# Altium footprint library Разъемы.PcbLib: 291 footprints (part 7 of 19)
Each footprint in its own frame and in the unit in brackets; x right, y up, seen from the top. Pads: shape width x height; smd on the part's side, far side on the other; paste and mask are expansions set on the pad; w line width, h text height; cw(c..) or ccw(c..) is an arc to the next point about the centre after c.
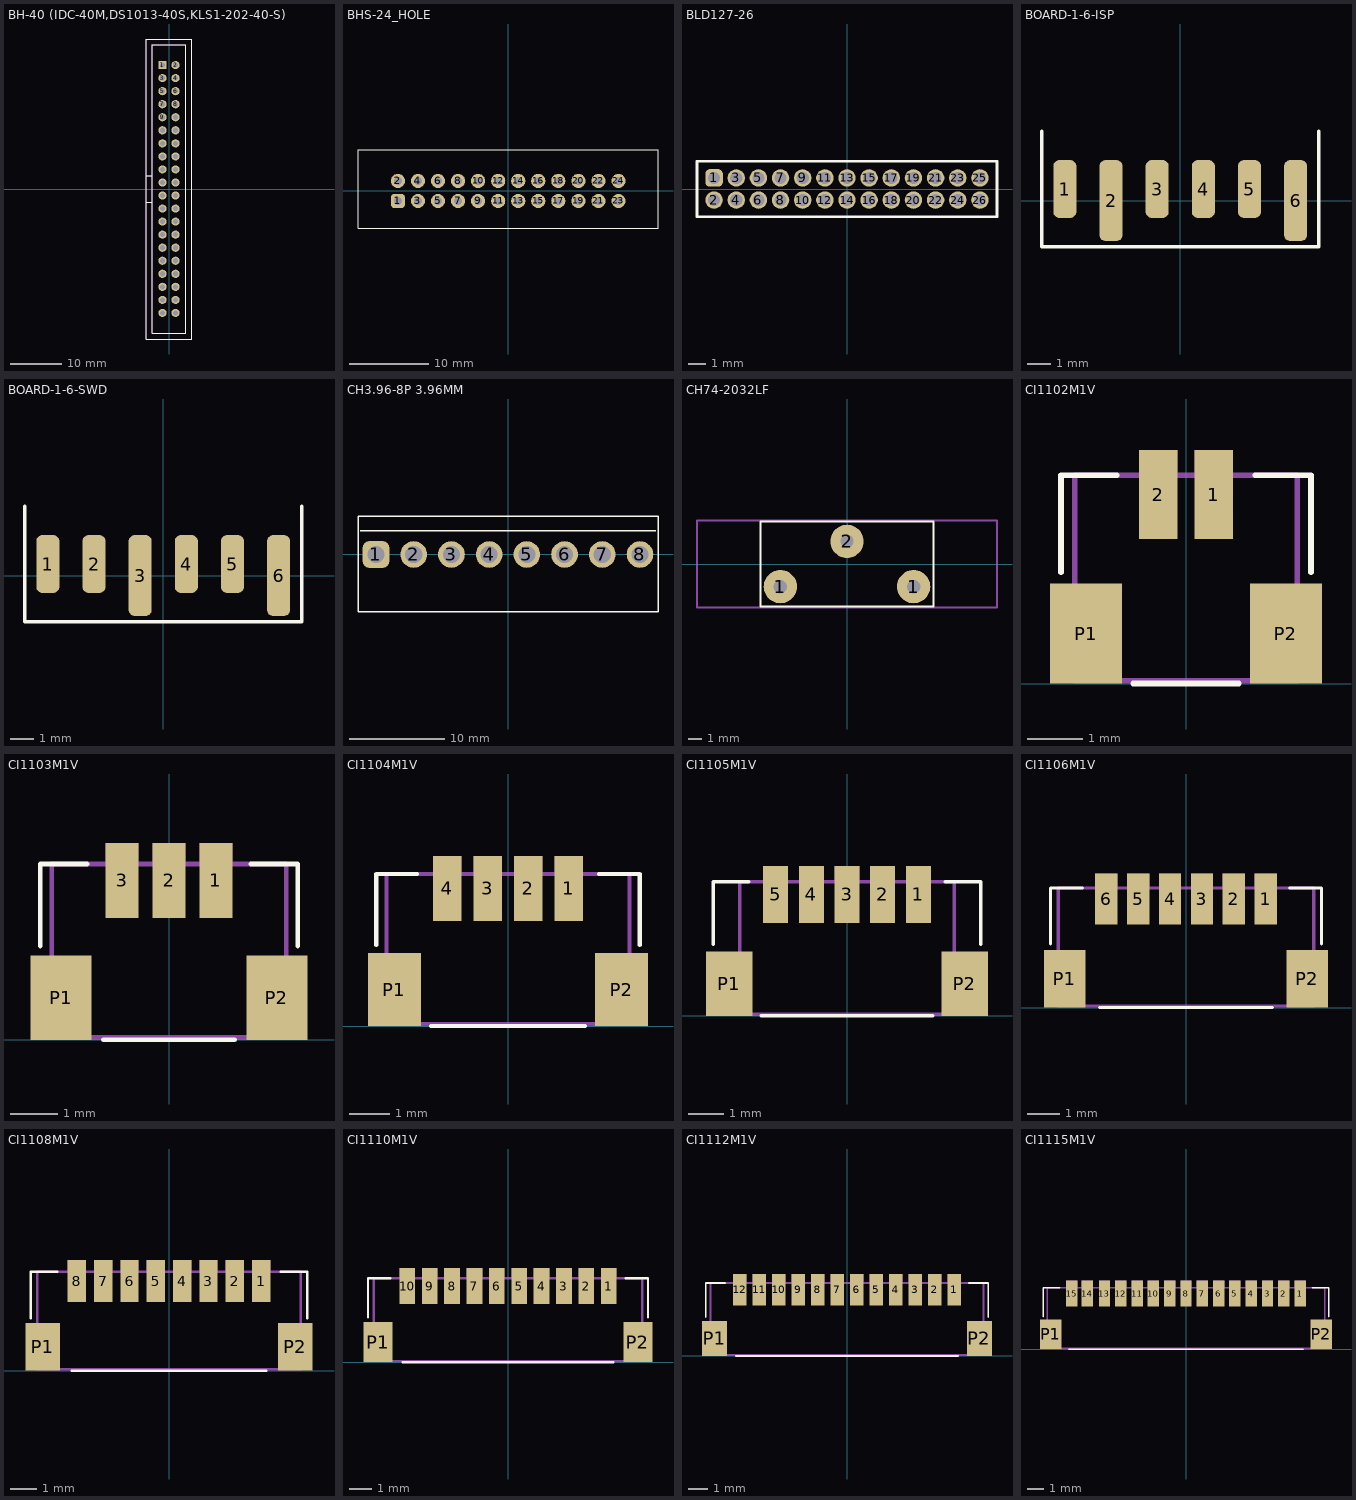
[diagram p6: the footprints below, top view; thin cyan lines are the x and y axes]

## BH-40 (IDC-40M,DS1013-40S,KLS1-202-40-S) [mm]
height 9
pads (40):
  rect 1.6x1.6 hole 1: 1(-1.27,24.13)
  round 1.6 hole 1: 2(1.27,24.13) 3(-1.27,21.59) 4(1.27,21.59) 5(-1.27,19.05) 6(1.27,19.05) 7(-1.27,16.51) 8(1.27,16.51) 9(-1.27,13.97) 10(1.27,13.97) 11(-1.27,11.43) 12(1.27,11.43) 13(-1.27,8.89) 14(1.27,8.89) 15(-1.27,6.35) 16(1.27,6.35) 17(-1.27,3.81) 18(1.27,3.81) 19(-1.27,1.27) 20(1.27,1.27) 21(-1.27,-1.27) 22(1.27,-1.27) 23(-1.27,-3.81) 24(1.27,-3.81) 25(-1.27,-6.35) 26(1.27,-6.35) 27(-1.27,-8.89) 28(1.27,-8.89) 29(-1.27,-11.43) 30(1.27,-11.43) 31(-1.27,-13.97) 32(1.27,-13.97) 33(-1.27,-16.51) 34(1.27,-16.51) 35(-1.27,-19.05) 36(1.27,-19.05) 37(-1.27,-21.59) 38(1.27,-21.59) 39(-1.27,-24.13) 40(1.27,-24.13)
Top Overlay:
  lines w0.1: -4.47,-2.54 -3.25,-2.54 ; -4.47,2.54 -3.25,2.54 ; -4.47,-29.21 -4.47,29.21 4.47,29.21 4.47,-29.21 -4.47,-29.21 ; -3.25,-28.06 3.25,-28.06 3.25,28.06 -3.25,28.06 -3.25,-28.06
Mechanical 1:
  lines w0.1: -4.47,-2.54 -3.25,-2.54 ; -4.47,2.54 -3.25,2.54 ; -4.47,-29.21 4.47,-29.21 4.47,29.21 -4.47,29.21 -4.47,-29.21 ; -3.25,-28.06 -3.25,28.06 3.25,28.06 3.25,-28.06 -3.25,-28.06
3D body "BH-40 (IDC-40M,DS1013-40S,KLS1-202-40-S).STEP": height 9.1, standoff -3.1, extent -4.475,-29.21 4.475,29.21

## BHS-24_HOLE [mm]
pads (24):
  rrect50% 1.8x1.8 hole 1: 1(-13.945,-1.266)
  round 1.8 hole 1: 2(-13.945,1.274) 3(-11.405,-1.266) 4(-11.405,1.274) 5(-8.865,-1.266) 6(-8.865,1.274) 7(-6.325,-1.266) 8(-6.325,1.274) 9(-3.785,-1.266) 10(-3.785,1.274) 11(-1.245,-1.266) 12(-1.245,1.274) 13(1.295,-1.266) 14(1.295,1.274) 15(3.835,-1.266) 16(3.835,1.274) 17(6.375,-1.266) 18(6.375,1.274) 19(8.915,-1.266) 20(8.915,1.274) 21(11.455,-1.266) 22(11.455,1.274) 23(13.995,-1.266) 24(13.995,1.274)
Top Overlay:
  lines w0.15: -19,-4.75 0,-4.75 19,-4.75 19,0 19,5.25 -0.25,5.25 -19,5.25 -19,0.25 -19,-4.75
  text "." at -14,-5.25 h0.1
Mechanical 29:
  circle w0.15: c-13.945,-1.266 r0.554
3D body "IDC-24MS.STEP": height 9.1, standoff -3, extent -19.04,-4.55 19.04,5.05

## BLD127-26 [mm]
pads (26):
  rrect50% 1x1 hole 0.7: 1(-7.62,0.635)
  round 1 hole 0.7: 2(-7.62,-0.635) 3(-6.35,0.635) 4(-6.35,-0.635) 5(-5.08,0.635) 6(-5.08,-0.635) 7(-3.81,0.635) 8(-3.81,-0.635) 9(-2.54,0.635) 10(-2.54,-0.635) 11(-1.27,0.635) 12(-1.27,-0.635) 13(0,0.635) 14(0,-0.635) 15(1.27,0.635) 16(1.27,-0.635) 17(2.54,0.635) 18(2.54,-0.635) 19(3.81,0.635) 20(3.81,-0.635) 21(5.08,0.635) 22(5.08,-0.635) 23(6.35,0.635) 24(6.35,-0.635) 25(7.62,0.635) 26(7.62,-0.635)
Top Overlay:
  lines w0.15: -8.6,-1.6 -8.6,-0.2 -8.6,1.6 0.2,1.6 8.6,1.6 8.6,-0.2 8.6,-1.6 0.2,-1.6 -8.6,-1.6
  text "." at -7.921,1.929 h0.1
3D body "62201021821 (rev1).stp": height 4.75, standoff -1.95, extent 1.725,-1.5 8.475,1.5
3D body "62201621821 (rev1).stp": height 4.75, standoff -1.95, extent -8.48,-1.5 2.08,1.5

## BOARD-1-6-ISP [mm]
pads (6):
  rrect50% 1x2.5 smd: 1(-5,0.5) 3(-1,0.5) 4(1,0.5) 5(3,0.5)
  rrect50% 1x3.5 smd: 2(-3,0) 6(5,0)
Top Overlay:
  lines w0.15: -6,3 -6,-2 6,-2 6,3
  text "." at -5,2.5 h0.1
Top Designator:
  text ".Designator" at -3.999,0.233 h0.8

## BOARD-1-6-SWD [mm]
pads (6):
  rrect50% 1x2.5 smd: 1(-5,0.5) 2(-3,0.5) 4(1,0.5) 5(3,0.5)
  rrect50% 1x3.5 smd: 3(-1,0) 6(5,0)
Top Overlay:
  lines w0.15: -6,3 -6,-2 6,-2 6,3
  text "." at -5,2.5 h0.1
Top Designator:
  text ".Designator" at -3.999,0.233 h0.8

## CH3.96-8P 3.96MM [mm]
height 22
pads (8):
  rrect50% 2.8x2.8 hole 1.8: 1(-13.86,0)
  round 2.8 hole 1.8: 2(-9.9,0) 3(-5.94,0) 4(-1.98,0) 5(1.98,0) 6(5.94,0) 7(9.9,0) 8(13.86,0)
Top Overlay:
  lines w0.15: -15.5,2.5 15.5,2.5 ; -15.75,-6 -15.75,0 -15.75,4 0,4 15.75,4 15.75,-6 0,-6 -15.75,-6
  text "." at -13.75,-6.75 h0.1
3D body "CH3.96-8P 3.96MM.STEP": height 13.5, standoff -4, extent -15.84,-6 15.84,4

## CH74-2032LF [mm]
height 18.1
pads (3):
  round 2.5 hole 1: 1(-5,-1.7) 1(5,-1.7) 2(0,1.7)
Top Overlay:
  lines w0.15: -6.5,-3.2 6.5,-3.2 6.5,3.2 -6.5,3.2 -6.5,-3.2
Top Courtyard:
  lines w0.15: -11.25,-3.25 -11.25,3.25 11.25,3.25 11.25,-3.25 -11.25,-3.25
3D body "User Library-Battery holder CR 2032.step": height 18.2, standoff -2.9, extent -11.249,-3.2 11.25,3.2

## CI1102M1V [mm]
height 4.3
pads (4):
  rect 0.7x1.6 smd: 1(0.5,3.4) 2(-0.5,3.4)
  rect 1.3x1.8 smd: P1(-1.8,0.9) P2(1.8,0.9)
Top Overlay:
  lines w0.1: -2.25,2 -2.25,3.75 -1.25,3.75 ; -0.95,0 0.95,0 ; 1.25,3.75 2.25,3.75 2.25,2
Top Solder:
  rectangle: -0.952,2.498 0.952,4.302
Mechanical 1:
  rectangle: 0.15,3.75 0.85,4.2
  rectangle: -0.85,3.75 -0.15,4.2
  lines w0.1: -2,0.05 2,0.05 2,3.75 -2,3.75 -2,0.05
3D body "CI1102M1V.STEP": height 4.3, standoff 0, extent -2,0.05 2,3.75

## CI1103M1V [mm]
height 4.3
pads (5):
  rect 0.7x1.6 smd: 1(1,3.4) 2(0,3.4) 3(-1,3.4)
  rect 1.3x1.8 smd: P1(-2.3,0.9) P2(2.3,0.9)
Top Overlay:
  lines w0.1: -2.75,2 -2.75,3.75 -1.75,3.75 ; -1.4,0 1.4,0 ; 1.75,3.75 2.75,3.75 2.75,2
Top Solder:
  rectangle: -1.452,2.498 1.452,4.302
Mechanical 1:
  rectangle: -0.35,3.75 0.35,4.2
  rectangle: 0.65,3.75 1.35,4.2
  rectangle: -1.35,3.75 -0.65,4.2
  lines w0.1: -2.5,0.05 -2.5,3.75 2.5,3.75 2.5,0.05 -2.5,0.05
3D body "CI1103M1V.STEP": height 4.3, standoff 0, extent -2.5,0.05 2.5,3.75

## CI1104M1V [mm]
height 4.3
pads (6):
  rect 0.7x1.6 smd: 1(1.5,3.4) 2(0.5,3.4) 3(-0.5,3.4) 4(-1.5,3.4)
  rect 1.3x1.8 smd: P1(-2.8,0.9) P2(2.8,0.9)
Top Overlay:
  lines w0.1: -3.25,2 -3.25,3.75 -2.25,3.75 ; -1.9,0 1.9,0 ; 2.25,3.75 3.25,3.75 3.25,2
Top Solder:
  rectangle: -1.952,2.498 1.952,4.302
Mechanical 1:
  rectangle: 1.15,3.75 1.85,4.2
  rectangle: 0.15,3.75 0.85,4.2
  rectangle: -0.85,3.75 -0.15,4.2
  rectangle: -1.85,3.75 -1.15,4.2
  lines w0.1: -3,0.05 -3,3.75 3,3.75 3,0.05 -3,0.05
3D body "CI1104M1V.STEP": height 4.3, standoff 0, extent -3,0.05 3,3.75

## CI1105M1V [mm]
height 4.3
pads (7):
  rect 0.7x1.6 smd: 1(2,3.4) 2(1,3.4) 3(0,3.4) 4(-1,3.4) 5(-2,3.4)
  rect 1.3x1.8 smd: P1(-3.3,0.9) P2(3.3,0.9)
Top Overlay:
  lines w0.1: -3.75,2 -3.75,3.75 -2.75,3.75 ; -2.4,0 2.4,0 ; 2.75,3.75 3.75,3.75 3.75,2
Top Solder:
  rectangle: -2.452,2.498 2.452,4.302
Mechanical 1:
  rectangle: 1.65,3.75 2.35,4.2
  rectangle: 0.65,3.75 1.35,4.2
  rectangle: -1.35,3.75 -0.65,4.2
  rectangle: -2.35,3.75 -1.65,4.2
  rectangle: -0.35,3.75 0.35,4.2
  lines w0.1: -3,0.05 -3,3.75 3,3.75 3,0.05 -3,0.05
3D body "CI1104M1V.STEP": height 4.3, standoff 0, extent -3,0.05 3,3.75

## CI1106M1V [mm]
height 4.3
pads (8):
  rect 0.7x1.6 smd: 1(2.5,3.4) 2(1.5,3.4) 3(0.5,3.4) 4(-0.5,3.4) 5(-1.5,3.4) 6(-2.5,3.4)
  rect 1.3x1.8 smd: P1(-3.8,0.9) P2(3.8,0.9)
Top Overlay:
  lines w0.1: -4.25,2 -4.25,3.75 -3.25,3.75 ; -2.7,0 2.7,0 ; 3.25,3.75 4.25,3.75 4.25,2
Top Solder:
  rectangle: -2.952,2.498 2.952,4.302
Mechanical 1:
  rectangle: -2.85,3.75 -2.15,4.2
  rectangle: -1.85,3.75 -1.15,4.2
  rectangle: -0.85,3.75 -0.15,4.2
  rectangle: 0.15,3.75 0.85,4.2
  rectangle: 1.15,3.75 1.85,4.2
  rectangle: 2.15,3.75 2.85,4.2
  lines w0.1: -4,0.05 4,0.05 4,3.75 -4,3.75 -4,0.05
3D body "CI1106M1V.STEP": height 4.3, standoff 0, extent -4,0.05 4,3.75

## CI1108M1V [mm]
height 4.3
pads (10):
  rect 0.7x1.6 smd: 1(3.5,3.4) 2(2.5,3.4) 3(1.5,3.4) 4(0.5,3.4) 5(-0.5,3.4) 6(-1.5,3.4) 7(-2.5,3.4) 8(-3.5,3.4)
  rect 1.3x1.8 smd: P1(-4.8,0.9) P2(4.8,0.9)
Top Overlay:
  lines w0.1: -5.25,2 -5.25,3.75 -4.25,3.75 ; -3.7,0 3.7,0 ; 4.25,3.75 5.25,3.75 5.25,2
Top Solder:
  rectangle: -3.952,2.498 3.951,4.301
Mechanical 1:
  rectangle: -3.85,3.75 -3.15,4.2
  rectangle: -2.85,3.75 -2.15,4.2
  rectangle: -1.85,3.75 -1.15,4.2
  rectangle: -0.85,3.75 -0.15,4.2
  rectangle: 0.15,3.75 0.85,4.2
  rectangle: 1.15,3.75 1.85,4.2
  rectangle: 2.15,3.75 2.85,4.2
  rectangle: 3.15,3.75 3.85,4.2
  lines w0.1: -5,0.05 5,0.05 5,3.75 -5,3.75 -5,0.05
3D body "CI1108M1V.STEP": height 4.3, standoff 0, extent -5,0.05 5,3.75

## CI1110M1V [mm]
height 4.3
pads (12):
  rect 0.7x1.6 smd: 1(4.5,3.4) 2(3.5,3.4) 3(2.5,3.4) 4(1.5,3.4) 5(0.5,3.4) 6(-0.5,3.4) 7(-1.5,3.4) 8(-2.5,3.4) 9(-3.5,3.4) 10(-4.5,3.4)
  rect 1.3x1.8 smd: P1(-5.8,0.9) P2(5.8,0.9)
Top Overlay:
  lines w0.1: -6.25,2 -6.25,3.75 -5.25,3.75 ; -4.7,0 4.7,0 ; 5.25,3.75 6.25,3.75 6.25,2
Top Solder:
  rectangle: -4.952,2.498 4.952,4.302
Mechanical 1:
  rectangle: -4.85,3.75 -4.15,4.2
  rectangle: -3.85,3.75 -3.15,4.2
  rectangle: -2.85,3.75 -2.15,4.2
  rectangle: -1.85,3.75 -1.15,4.2
  rectangle: -0.85,3.75 -0.15,4.2
  rectangle: 0.15,3.75 0.85,4.2
  rectangle: 1.15,3.75 1.85,4.2
  rectangle: 2.15,3.75 2.85,4.2
  rectangle: 3.15,3.75 3.85,4.2
  rectangle: 4.15,3.75 4.85,4.2
  lines w0.1: -6,0.05 6,0.05 6,3.75 -6,3.75 -6,0.05
3D body "CI1110M1V.STEP": height 4.3, standoff 0, extent -6,0.05 6,3.75

## CI1112M1V [mm]
height 4.3
pads (14):
  rect 0.7x1.6 smd: 1(5.5,3.4) 2(4.5,3.4) 3(3.5,3.4) 4(2.5,3.4) 5(1.5,3.4) 6(0.5,3.4) 7(-0.5,3.4) 8(-1.5,3.4) 9(-2.5,3.4) 10(-3.5,3.4) 11(-4.5,3.4) 12(-5.5,3.4)
  rect 1.3x1.8 smd: P1(-6.8,0.9) P2(6.8,0.9)
Top Overlay:
  lines w0.1: -7.25,2 -7.25,3.75 -6.25,3.75 ; -5.7,0 5.7,0 ; 6.25,3.75 7.25,3.75 7.25,2
Top Solder:
  rectangle: -5.952,2.498 5.952,4.302
Mechanical 1:
  rectangle: -5.85,3.75 -5.15,4.2
  rectangle: -4.85,3.75 -4.15,4.2
  rectangle: -3.85,3.75 -3.15,4.2
  rectangle: -2.85,3.75 -2.15,4.2
  rectangle: -1.85,3.75 -1.15,4.2
  rectangle: -0.85,3.75 -0.15,4.2
  rectangle: 0.15,3.75 0.85,4.2
  rectangle: 1.15,3.75 1.85,4.2
  rectangle: 2.15,3.75 2.85,4.2
  rectangle: 3.15,3.75 3.85,4.2
  rectangle: 4.15,3.75 4.85,4.2
  rectangle: 5.15,3.75 5.85,4.2
  lines w0.1: -7,0.05 7,0.05 7,3.75 -7,3.75 -7,0.05
3D body "CI1112M1V.STEP": height 4.3, standoff 0, extent -7,0.05 7,3.75

## CI1115M1V [mm]
height 4.3
pads (17):
  rect 0.7x1.6 smd: 1(7,3.4) 2(6,3.4) 3(5,3.4) 4(4,3.4) 5(3,3.4) 6(2,3.4) 7(1,3.4) 8(0,3.4) 9(-1,3.4) 10(-2,3.4) 11(-3,3.4) 12(-4,3.4) 13(-5,3.4) 14(-6.05,3.4) 15(-7,3.4)
  rect 1.3x1.8 smd: P1(-8.3,0.9) P2(8.3,0.9)
Top Overlay:
  lines w0.1: -8.75,2 -8.75,3.75 -7.75,3.75 ; -7.2,0 7.2,0 ; 7.75,3.75 8.75,3.75 8.75,2
Top Solder:
  rectangle: -7.452,2.498 7.452,4.302
Mechanical 1:
  rectangle: -7.35,3.75 -6.65,4.2
  rectangle: -6.4,3.75 -5.7,4.2
  rectangle: -5.35,3.75 -4.65,4.2
  rectangle: -4.35,3.75 -3.65,4.2
  rectangle: -3.35,3.75 -2.65,4.2
  rectangle: -2.35,3.75 -1.65,4.2
  rectangle: -1.35,3.75 -0.65,4.2
  rectangle: -0.35,3.75 0.35,4.2
  rectangle: 0.65,3.75 1.35,4.2
  rectangle: 1.65,3.75 2.35,4.2
  rectangle: 2.65,3.75 3.35,4.2
  rectangle: 3.65,3.75 4.35,4.2
  rectangle: 4.65,3.75 5.35,4.2
  rectangle: 5.65,3.75 6.35,4.2
  rectangle: 6.65,3.75 7.35,4.2
  lines w0.1: -8.5,0.05 -8.5,3.75 8.5,3.75 8.5,0.05 -8.5,0.05
3D body "CI1115M1V.STEP": height 4.3, standoff 0, extent -8.5,0.05 8.5,3.75